# Altium footprint library MyLib.PcbLib: 45 footprints (part 3 of 3)
Each footprint in its own frame and in the unit in brackets; x right, y up, seen from the top. Pads: shape width x height; smd on the part's side, far side on the other; paste and mask are expansions set on the pad; w line width, h text height; cw(c..) or ccw(c..) is an arc to the next point about the centre after c.
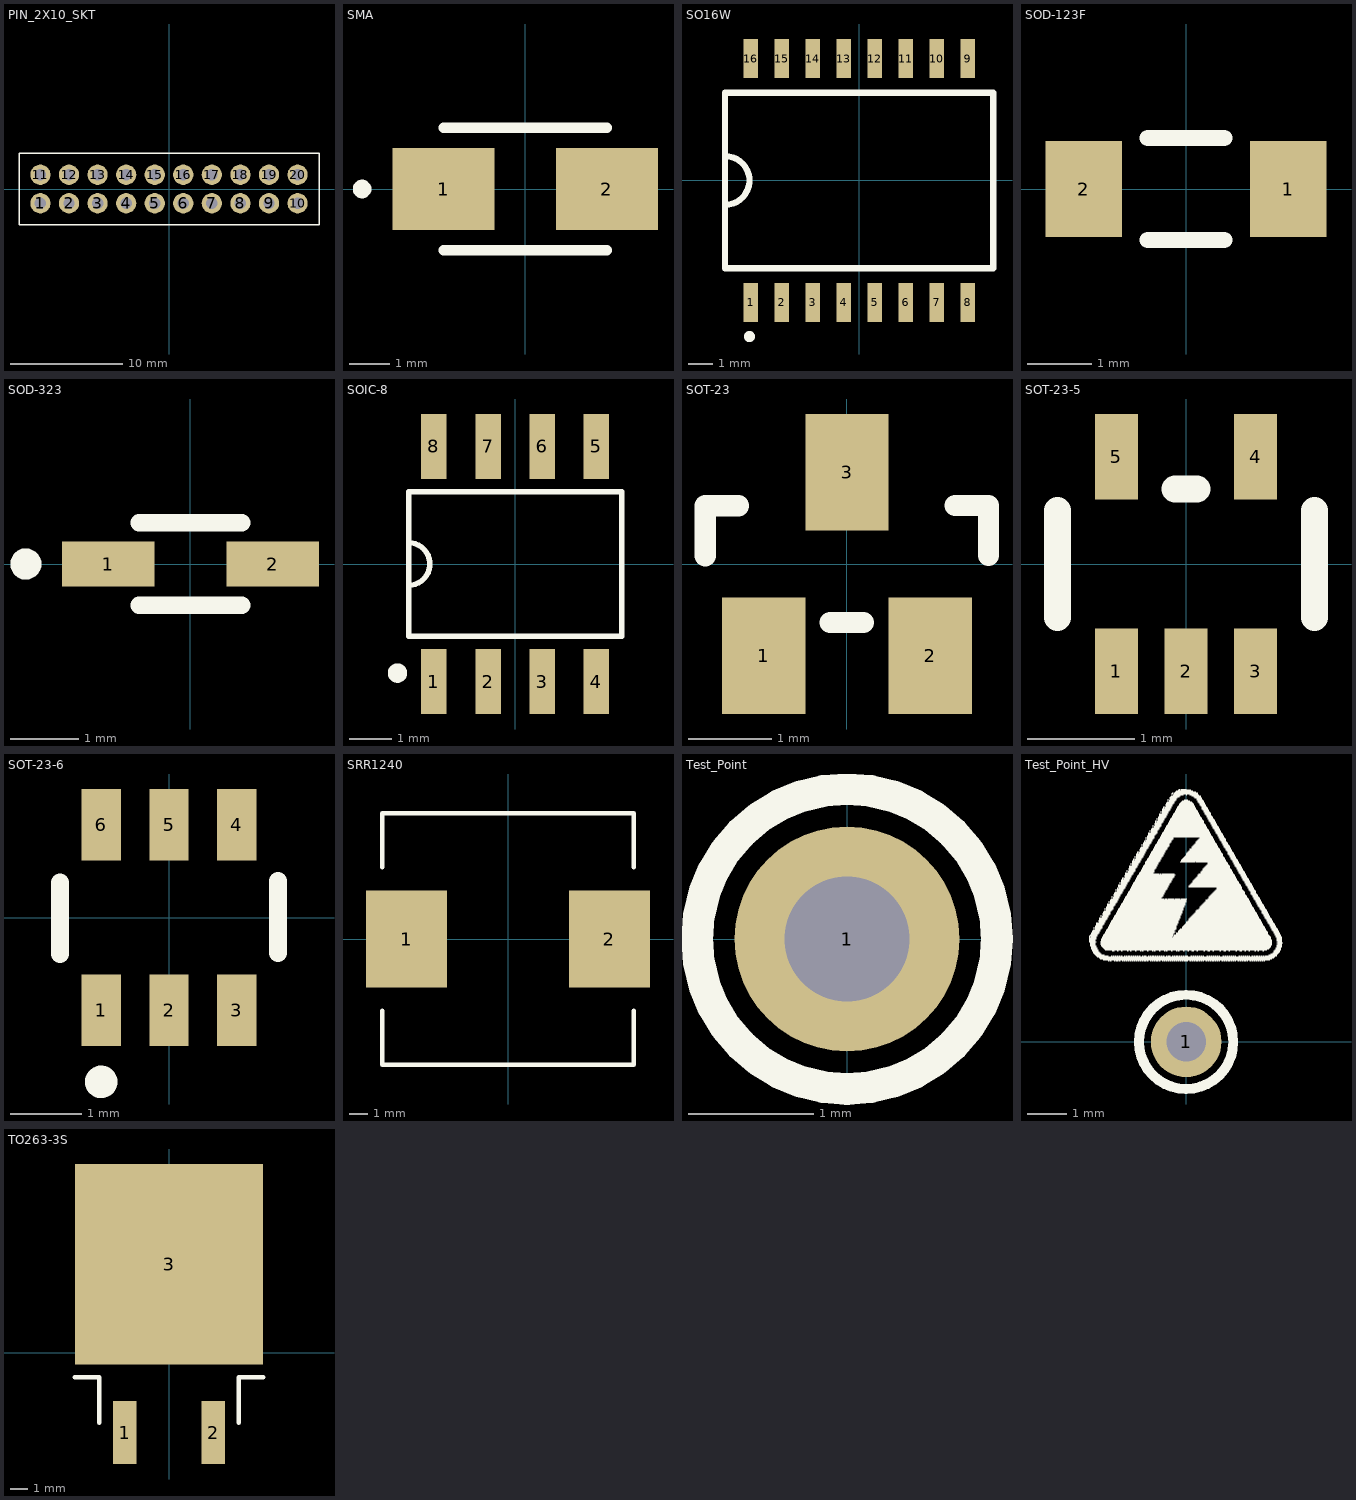
[diagram p2: the footprints below, top view; thin cyan lines are the x and y axes]

## PIN_2X10_SKT [mm]
pads (20):
  round 1.8 hole 1.02: 1(-11.43,-1.27) 2(-8.89,-1.27) 3(-6.35,-1.27) 4(-3.81,-1.27) 5(-1.27,-1.27) 6(1.27,-1.27) 7(3.81,-1.27) 8(6.35,-1.27) 9(8.89,-1.27) 10(11.43,-1.27) 11(-11.43,1.27) 12(-8.89,1.27) 13(-6.35,1.27) 14(-3.81,1.27) 15(-1.27,1.27) 16(1.27,1.27) 17(3.81,1.27) 18(6.35,1.27) 19(8.89,1.27) 20(11.43,1.27)
Top Overlay:
  lines w0.127: -13.335,-3.175 -13.335,3.175 13.335,3.175 13.335,-3.175 -13.335,-3.175
3D body "SSW-110-01-L-D.stp": height 8.51, standoff -2.64, extent -12.954,-2.477 12.954,2.477

## SMA [mm]
pads (2):
  rect 2.5x2 smd: 1(-2,0) 2(2,0)
Top Overlay:
  circle w0.254: c-4,0 r0.1
  lines w0.254: -2,-1.5 2,-1.5 ; -2,1.5 2,1.5
3D body: height 0.25, standoff -8.2, extent -0.7,2.6 -0.7,2.6
3D body "User Library-DO-214AC_SMA.step": height 2.15, standoff -0.05, extent -2.5,-1.35 2.5,1.35

## SO16W [mm]
pads (16):
  rect 0.6x1.6 smd: 1(-4.445,-5) 2(-3.175,-5) 3(-1.905,-5) 4(-0.635,-5) 5(0.635,-5) 6(1.905,-5) 7(3.175,-5) 8(4.445,-5) 9(4.445,5) 10(3.175,5) 11(1.905,5) 12(0.635,5) 13(-0.635,5) 14(-1.905,5) 15(-3.175,5) 16(-4.445,5)
Top Overlay:
  circle w0.254: c-4.5,-6.4 r0.1
  lines w0.254: -5.5,-1 ccw(c-5.5,0) -5.5,1 ; -5.5,-3.6 -5.5,3.6 5.5,3.6 5.5,-3.6 -5.5,-3.6
3D body "User Library-SO-16W.STEP": height 2.48, standoff 0, extent -5.165,-5.255 5.165,5.055

## SOD-123F [mm]
pads (2):
  rect 1.2x1.5 smd: 1(1.6,0) 2(-1.6,0)
Top Overlay:
  lines w0.254: -0.6,-0.8 0.6,-0.8 ; -0.6,0.8 0.6,0.8
3D body "User Library-SOD123F.STEP": height 1.2, standoff -0.01, extent -1.9,-0.85 1.85,0.85

## SOD-323 [mm]
pads (2):
  rect 1.35x0.65 smd: 1(-1.2,0) 2(1.2,0)
Top Overlay:
  circle w0.254: c-2.4,0 r0.1
  lines w0.254: -0.75,-0.6 0.75,-0.6 ; -0.75,0.6 0.75,0.6
3D body "SW3dPS-SOD-323.STEP": height 1.1, standoff 0, extent -1.3,-0.675 1.3,0.675

## SOIC-8 [mm]
pads (8):
  rect 0.6x1.52 smd: 1(-1.905,-2.76) 2(-0.635,-2.76) 3(0.635,-2.76) 4(1.905,-2.76) 5(1.905,2.76) 6(0.635,2.76) 7(-0.635,2.76) 8(-1.905,2.76)
Top Overlay:
  circle w0.254: c-2.76,-2.56 r0.1
  lines w0.127: -2.5,-0.5 ccw(c-2.5,0) -2.5,0.5 ; -2.5,-1.7 2.5,-1.7 2.5,1.7 -2.5,1.7 -2.5,-1.7
3D body "User Library-SOIC8_JEDEC_MS-012AA.STEP": height 1.75, standoff -0.01, extent -2.5,-3.099 2.5,3.1

## SOT-23 [mm]
pads (3):
  rect 1x1.4 smd: 1(-1,-1.1) 2(1,-1.1) 3(0,1.1)
Top Overlay:
  lines w0.254: -1.7,0.1 -1.7,0.7 -1.3,0.7 ; -0.2,-0.7 0.2,-0.7 ; 1.3,0.7 1.7,0.7 1.7,0.1
3D body "CircuitWorks-SOT-23.step": height 1.15, standoff 0.05, extent -1.5,-1.25 1.5,1.25

## SOT-23-5 [mm]
pads (5):
  rect 0.4x0.8 smd: 1(-0.65,-1) 2(0,-1) 3(0.65,-1) 4(0.65,1) 5(-0.65,1)
Top Overlay:
  lines w0.254: -1.2,-0.5 -1.2,0.5 ; -0.1,0.7 0.1,0.7 ; 1.2,-0.5 1.2,0.5
3D body "User Library-TSSOP-5 (SOT-23-5 PITCH 0_65).STEP": height 1.1, standoff -0.01, extent -1.125,-1.125 1.125,1.125

## SOT-23-6 [mm]
pads (6):
  rect 0.55x1 smd: 1(-0.95,-1.3) 2(0,-1.3) 3(0.95,-1.3) 4(0.95,1.3) 5(0,1.3) 6(-0.95,1.3)
Top Overlay:
  circle w0.254: c-0.95,-2.3 r0.1
  lines w0.254: -1.524,-0.508 -1.524,0.492 ; 1.524,-0.492 1.524,0.508
3D body: height 0.25, standoff 0, extent 0,0 0,0
3D body "User Library-SOT23-6-2.step": height 1.45, standoff 0, extent -1.45,-1.4 1.45,1.4

## SRR1240 [mm]
pads (2):
  rect 4.5x5.4 smd: 1(-5.65,0) 2(5.65,0)
Top Overlay:
  lines w0.254: -7,-4 -7,-7 7,-7 7,-4 ; -7,4 -7,7 7,7 7,4
3D body "srr1240-101m.stp": height 4, standoff 0, extent -6.25,-6.25 6.25,6.25

## Test_Point [mm]
pads (1):
  round 1.8 hole 1: 1(0,0)
Top Overlay:
  circle w0.254: c0,0 r1.2

## Test_Point_HV [mm]
pads (1):
  round 1.8 hole 1: 1(0,0)
Top Overlay:
  drawing of 778 lines, arcs and shapes, not listed

## TO263-3S [mm]
pads (3):
  rect 1.35x3.6 smd: 1(-2.54,-4.575) 2(2.54,-4.575)
  rect 10.8x11.5 smd: 3(0,5.075)
Top Overlay:
  lines w0.254: -5.4,-1.4 -4,-1.4 -4,-4 ; 4,-4 4,-2 4,-1.4 5.4,-1.4
3D body "User Library-TO263-3S.STEP": height 4.78, standoff -0.02, extent -5,-5.49 5,10.18